# Altium footprint library AD_Lib.PcbLib: 508 footprints (part 26 of 32)
Each footprint in its own frame and in the unit in brackets; x right, y up, seen from the top. Pads: shape width x height; smd on the part's side, far side on the other; paste and mask are expansions set on the pad; w line width, h text height; cw(c..) or ccw(c..) is an arc to the next point about the centre after c.
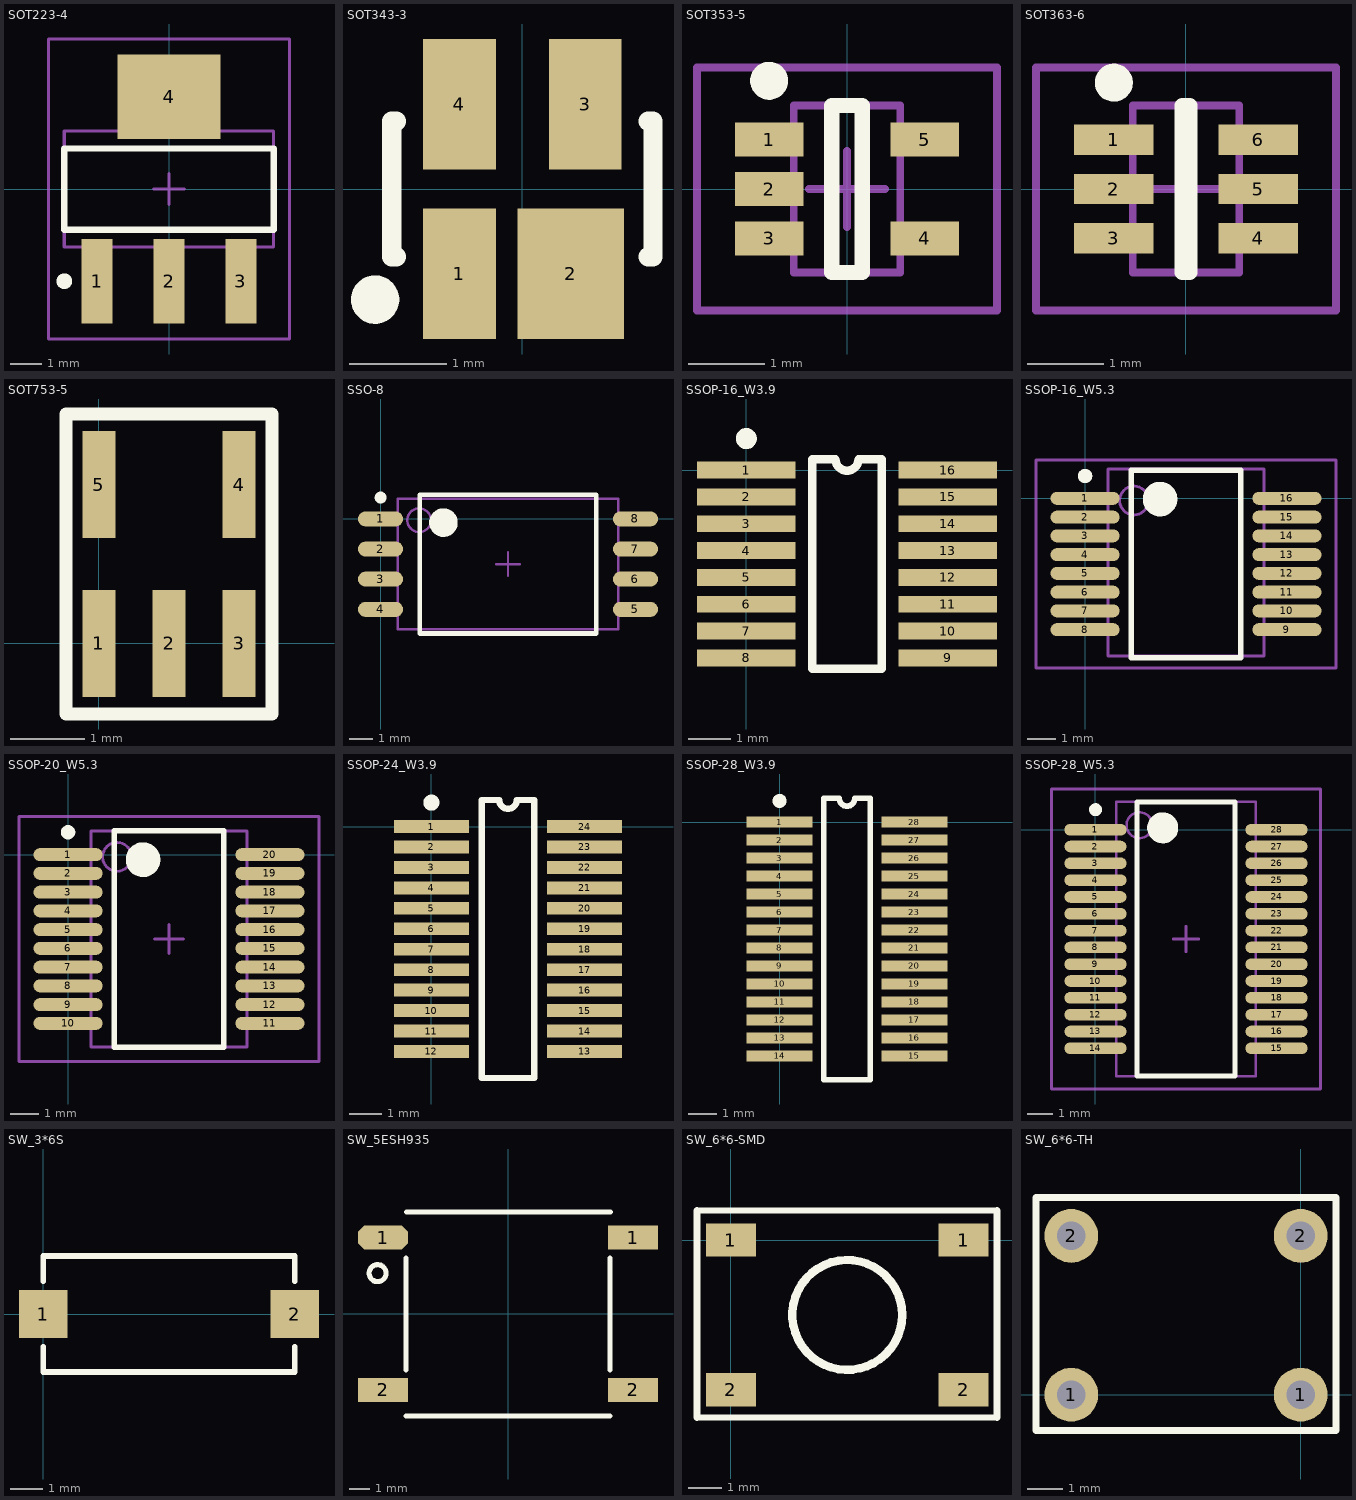
[diagram p25: the footprints below, top view; thin cyan lines are the x and y axes]

## SOT223-4 [mm] "SOT223, 4-Leads, Body 6.5x3.5mm, Pitch 2.3mm, Lead Span 7mm, IPC Low Density"
height 1.78
pads (4):
  rect 1x2.7 smd: 1(-2.3,-2.95) 2(0,-2.95) 3(2.3,-2.95)
  rect 3.3x2.7 smd: 4(0,2.95)
Top Overlay:
  circle w0.25: c-3.35,-2.95 r0.125
  lines w0.2: -3.35,-1.3 -3.35,1.3 3.35,1.3 3.35,-1.3 -3.35,-1.3
Mechanical 13:
  lines w0.1: -3.35,-1.85 -3.35,1.85 3.35,1.85 3.35,-1.85 -3.35,-1.85
Mechanical 15:
  lines w0.1: -0.5,0 0.5,0 ; 0,-0.5 0,0.5 ; -3.85,-4.8 -3.85,4.8 3.85,4.8 3.85,-4.8 -3.85,-4.8
3D body: height 1.78, standoff 0, extent -3.35,-1.85 3.35,1.85

## SOT343-3 [mm] "SOT-343; 4 Leads; Body 2.2 x 2.2 mm, inc. leads (LxW max)"
height 1
pads (4):
  rect 0.75x1.35 smd: 1(-0.65,-0.875) 3(0.65,0.875) 4(-0.65,0.875)
  rect 1.1x1.35 smd: 2(0.5,-0.875)
Top Overlay:
  circle w0.25: c-1.522,-1.143 r0.125
  lines w0.2: -1.3,-0.7 -1.35,-0.7 -1.35,0.7 -1.3,0.7 ; 1.3,-0.7 1.35,-0.7 1.35,0.7 1.3,0.7

## SOT353-5 [mm] "SC-70, 5-Leads, Body 2x1.3mm, Pitch 0.65mm, Lead Span 2.1mm, IPC Low Density"
height 1.1
pads (5):
  rect 0.9x0.45 smd: 1(-1.025,0.65) 2(-1.025,0) 3(-1.025,-0.65) 4(1.025,-0.65) 5(1.025,0.65)
Top Overlay:
  circle w0.25: c-1.025,1.425 r0.125
  lines w0.2: -0.2,-1.1 0.2,-1.1 0.2,1.1 -0.2,1.1 -0.2,-1.1
Mechanical 13:
  lines w0.1: -0.7,-1.1 -0.7,1.1 0.7,1.1 0.7,-1.1 -0.7,-1.1
Mechanical 15:
  lines w0.1: -0.5,0 0.5,0 ; 0,-0.5 0,0.5 ; -1.975,-1.6 -1.975,1.6 1.975,1.6 1.975,-1.6 -1.975,-1.6
3D body: height 1.1, standoff 0, extent -0.7,-1.1 0.7,1.1

## SOT363-6 [mm] "SC70-LT6, 6-Leads, Body 2x1.3mm, Pitch 0.65mm, Lead Span 2.1mm, IPC Low Density"
height 1.1
pads (6):
  rect 1.05x0.4 smd: 1(-0.95,0.65) 2(-0.95,0) 3(-0.95,-0.65) 4(0.95,-0.65) 5(0.95,0) 6(0.95,0.65)
Top Overlay:
  circle w0.25: c-0.95,1.4 r0.125
  lines w0.2: -0.05,-1.1 0.05,-1.1 0.05,1.1 -0.05,1.1 -0.05,-1.1
Mechanical 13:
  lines w0.1: -0.7,-1.1 -0.7,1.1 0.7,1.1 0.7,-1.1 -0.7,-1.1
Mechanical 15:
  lines w0.1: -0.5,0 0.5,0 ; 0,-0.5 0,0.5 ; -1.975,-1.6 -1.975,1.6 1.975,1.6 1.975,-1.6 -1.975,-1.6
3D body: height 1.1, standoff 0, extent -0.7,-1.1 0.7,1.1

## SOT753-5 [mm] "SOT-23/SC-74A; 5 Leads; Body 3.1 x 3 mm, inc. leads (LxW max)"
height 1.1
pads (5):
  rect 0.45x1.45 smd: 1(0,0) 2(0.95,0) 3(1.9,0) 4(1.9,2.15) 5(0,2.15)
Top Overlay:
  lines w0.178: -0.447,-0.957 -0.447,3.107 2.347,3.107 2.347,-0.957 -0.447,-0.957

## SSO-8 [mil] "隔离运放，ADI"
height 125.2
pads (8):
  oval 75x25 smd: 1(0,0) 2(0,-50) 3(0,-100) 4(0,-150) 5(423,-150) 6(423,-100) 7(423,-50) 8(423,0)
Top Overlay:
  circle w9.84: c0,35.43 r4.92
  circle w23.62: c104.33,-6.1 r11.81
  lines w7.87: 64.96,-190 64.96,40 358.04,40 358.04,-190 64.96,-190
Mechanical 13:
  circle w3.94: c63.98,-2.17 r19.68
  lines w3.94: 28.54,-183.27 28.54,33.27 394.46,33.27 394.46,-183.27 28.54,-183.27
Mechanical 15:
  lines w3.94: 191.81,-75 231.18,-75 ; 211.5,-94.69 211.5,-55.31
3D body: height 79.92, standoff 0, extent 28.54,-183.27 394.46,33.27

## SSOP-16_W3.9 [mm] "SSOP; 16 Leads; Body Width 3.9 mm; Pitch 0.64 mm"
height 1.75
pads (16):
  rect 2.35x0.4 smd: 1(0,0) 2(0,-0.64) 3(0,-1.28) 4(0,-1.92) 5(0,-2.56) 6(0,-3.2) 7(0,-3.84) 8(0,-4.48) 9(4.8,-4.48) 10(4.8,-3.84) 11(4.8,-3.2) 12(4.8,-2.56) 13(4.8,-1.92) 14(4.8,-1.28) 15(4.8,-0.64) 16(4.8,0)
Top Overlay:
  circle w0.25: c0,0.75 r0.125
  lines w0.2: 1.575,-4.74 1.575,0.26 2.125,0.26 ccw(c2.4,0.26) 2.675,0.26 3.225,0.26 3.225,-4.74 1.575,-4.74

## SSOP-16_W5.3 [mm] "SOP, 16-Leads, Body 6.2x5.3mm, Pitch 0.65mm, IPC Low Density"
height 1.99
pads (16):
  oval 2.4x0.45 smd: 1(0,0) 2(0,-0.65) 3(0,-1.3) 4(0,-1.95) 5(0,-2.6) 6(0,-3.25) 7(0,-3.9) 8(0,-4.55) 9(7,-4.55) 10(7,-3.9) 11(7,-3.25) 12(7,-2.6) 13(7,-1.95) 14(7,-1.3) 15(7,-0.65) 16(7,0)
Top Overlay:
  circle w0.25: c0,0.775 r0.125
  circle w0.6: c2.6,-0.025 r0.3
  lines w0.2: 1.6,-5.525 1.6,0.975 5.4,0.975 5.4,-5.525 1.6,-5.525
Mechanical 13:
  circle w0.1: c1.7,-0.075 r0.5
  lines w0.1: 0.8,-5.461 6.2,-5.461 6.2,1.016 0.8,1.016 0.8,-5.461
Mechanical 15:
  lines w0.1: -1.7,-5.875 -1.7,1.325 8.7,1.325 8.7,-5.875 -1.7,-5.875
3D body: height 1.99, standoff 0, extent 0.8,-5.461 6.2,1.016

## SSOP-20_W5.3 [mm] "SOP, 20-Leads, Body 7.2x5.3mm, Pitch 0.65mm, IPC Low Density"
height 1.99
pads (20):
  oval 2.4x0.45 smd: 1(0,0) 2(0,-0.65) 3(0,-1.3) 4(0,-1.95) 5(0,-2.6) 6(0,-3.25) 7(0,-3.9) 8(0,-4.55) 9(0,-5.2) 10(0,-5.85) 11(7,-5.85) 12(7,-5.2) 13(7,-4.55) 14(7,-3.9) 15(7,-3.25) 16(7,-2.6) 17(7,-1.95) 18(7,-1.3) 19(7,-0.65) 20(7,0)
Top Overlay:
  circle w0.6: c2.6,-0.175 r0.3
  circle w0.25: c0,0.775 r0.125
  lines w0.2: 1.6,-6.675 5.4,-6.675 5.4,0.825 1.6,0.825 1.6,-6.675
Mechanical 13:
  circle w0.1: c1.7,-0.075 r0.5
  lines w0.1: 0.8,-6.675 6.2,-6.675 6.2,0.825 0.8,0.825 0.8,-6.675
Mechanical 15:
  lines w0.1: 3,-2.925 4,-2.925 ; 3.5,-3.425 3.5,-2.425 ; -1.7,-7.175 8.7,-7.175 8.7,1.325 -1.7,1.325 -1.7,-7.175
3D body: height 1.99, standoff 0, extent 0.8,-6.675 6.2,0.825

## SSOP-24_W3.9 [mm] "SSOP; 24 Leads; Body Width 3.9 mm; Pitch 0.64 mm"
height 1.75
pads (24):
  rect 2.35x0.4 smd: 1(0,0) 2(0,-0.64) 3(0,-1.28) 4(0,-1.92) 5(0,-2.56) 6(0,-3.2) 7(0,-3.84) 8(0,-4.48) 9(0,-5.12) 10(0,-5.76) 11(0,-6.4) 12(0,-7.04) 13(4.8,-7.04) 14(4.8,-6.4) 15(4.8,-5.76) 16(4.8,-5.12) 17(4.8,-4.48) 18(4.8,-3.84) 19(4.8,-3.2) 20(4.8,-2.56) 21(4.8,-1.92) 22(4.8,-1.28) 23(4.8,-0.64) 24(4.8,0)
Top Overlay:
  circle w0.25: c0,0.75 r0.125
  lines w0.2: 1.575,-7.87 1.575,0.83 2.125,0.83 ccw(c2.4,0.83) 2.675,0.83 3.225,0.83 3.225,-7.87 1.575,-7.87

## SSOP-28_W3.9 [mm] "SSOP; 28 Leads; Body Width 3.9 mm; Pitch 0.64 mm"
height 1.75
pads (28):
  rect 2.35x0.4 smd: 1(0,0) 2(0,-0.64) 3(0,-1.28) 4(0,-1.92) 5(0,-2.56) 6(0,-3.2) 7(0,-3.84) 8(0,-4.48) 9(0,-5.12) 10(0,-5.76) 11(0,-6.4) 12(0,-7.04) 13(0,-7.68) 14(0,-8.32) 15(4.8,-8.32) 16(4.8,-7.68) 17(4.8,-7.04) 18(4.8,-6.4) 19(4.8,-5.76) 20(4.8,-5.12) 21(4.8,-4.48) 22(4.8,-3.84) 23(4.8,-3.2) 24(4.8,-2.56) 25(4.8,-1.92) 26(4.8,-1.28) 27(4.8,-0.64) 28(4.8,0)
Top Overlay:
  circle w0.25: c0,0.75 r0.125
  lines w0.2: 1.575,-9.16 3.225,-9.16 3.225,0.84 2.675,0.84 cw(c2.4,0.84) 2.125,0.84 1.575,0.84 1.575,-9.16

## SSOP-28_W5.3 [mm] "SSOP, Plastic; 28 Leads; Body Width 5.3 mm; Pitch 0.65 mm"
height 1.99
pads (28):
  oval 2.4x0.45 smd: 1(0,0) 2(0,-0.65) 3(0,-1.3) 4(0,-1.95) 5(0,-2.6) 6(0,-3.25) 7(0,-3.9) 8(0,-4.55) 9(0,-5.2) 10(0,-5.85) 11(0,-6.5) 12(0,-7.15) 13(0,-7.8) 14(0,-8.45) 15(7,-8.45) 16(7,-7.8) 17(7,-7.15) 18(7,-6.5) 19(7,-5.85) 20(7,-5.2) 21(7,-4.55) 22(7,-3.9) 23(7,-3.25) 24(7,-2.6) 25(7,-1.95) 26(7,-1.3) 27(7,-0.65) 28(7,0)
Top Overlay:
  circle w0.6: c2.6,0.075 r0.3
  circle w0.25: c0,0.775 r0.125
  lines w0.2: 1.6,-9.525 5.4,-9.525 5.4,1.075 1.6,1.075 1.6,-9.525
Mechanical 13:
  circle w0.1: c1.7,0.175 r0.5
  lines w0.1: 0.8,-9.525 6.2,-9.525 6.2,1.075 0.8,1.075 0.8,-9.525
Mechanical 15:
  lines w0.1: 3,-4.225 4,-4.225 ; 3.5,-4.725 3.5,-3.725 ; -1.7,-10.025 8.7,-10.025 8.7,1.575 -1.7,1.575 -1.7,-10.025
3D body: height 2, standoff 0, extent 0.8,-9.525 6.2,1.075

## SW_3*6S [mm] "按键，3*6，贴片"
pads (2):
  rect 1.5x1.5 smd: 1(0,0) 2(7.8,0)
Top Overlay:
  lines w0.178: 0,-1.016 0,-1.8 7.8,-1.8 7.8,-1.016 ; 0,1.016 0,1.8 7.8,1.8 7.8,1.016

## SW_5ESH935 [mm] "SPST按键"
pads (4):
  oct 2.5x1.2 smd: 1(-6.25,3.81)
  rect 2.5x1.2 smd: 1(6.25,3.81) 2(-6.25,-3.81) 2(6.25,-3.81)
Top Overlay:
  circle w0.254: c-6.52,2.032 r0.424
  lines w0.254: -5.1,-5.1 5.1,-5.1 ; -5.1,-2.8 -5.1,2.8 ; -5.08,5.08 5.12,5.08 ; 5.1,-2.8 5.1,2.8

## SW_6*6-SMD [mm] "按键，6*6，贴片"
pads (4):
  rect 1.5x1 smd: 1(0,0) 1(7,0) 2(0,-4.5) 2(7,-4.5)
Top Overlay:
  circle w0.254: c3.5,-2.25 r1.651
  lines w0.178: -1.016,-5.334 8.001,-5.334 ; -1.016,0.889 8.001,0.889
  lines w0.203: -1.016,-5.334 -1.016,0.889 ; 8.001,-5.334 8.001,0.889

## SW_6*6-TH [mm] "按键，6*6，直插"
pads (4):
  round 1.524 hole 0.8: 1(-6.5,0) 1(0,0) 2(-6.5,4.5) 2(0,4.5)
Top Overlay:
  lines w0.203: -7.5,-1.016 1,-1.016 1,5.588 -7.5,5.588 -7.5,-1.016